# Altium schematic symbol library BARKO_SCHLIB.SchLib: 1064 symbols (part 8 of 11) (continued)
## MD-UG IC PROFINET (continued)

## MDFLT-BNX024H01L
designator MD?, comment BNX024H01L
FILTER LC 4.7UF SMD; Manufacturer: Murata; Max Current Rating: 15A; Max Voltage Rating (DC): 50V; Number of Channels: 2; Attenuation Value: 35dB; ESD Protection: No; Frequency: 100kHz; Impedance: 50R; Washability: OK; .Creator: M.OZKAN; .PCBCHK: USED; Supplier 1: Arrow; Manufacturer Part Number: BNX024H01L; Stock 1: 4400; Pricing 1: 400=3,20590, 800=3,10980, 2400=2,96200, 1=6,65300, 10=5,66000, 25=4,50300, 100=4,02700, 250=3,56600 (USD); RoHS: Yes; Mount: Surface Mount; Case/Package: SMD/SMT; Min Operating Temperature: -55°C; Max Operating Temperature: 125°C; Termination: Flat; Voltage Rating: 50V; Packaging: Tape and Reel; Package Quantity: 1; Current Rating: 15A; Circuit Type: Filter; Current: 15A; Voltage Rating (DC): 50V; Length: 12.1mm; Height: 0.146inch; Width: 9.1mm; Depth: 9.1mm; Radiation Hardening: No; REACH SVHC: No SVHC; Lead Free: Lead Free; ComponentLink1URL: https://datasheet.ciiva.com/4941/murata20bnx20series-303196-4941968.pdf?src-supplier=Mouser; ComponentLink1Description: https://datasheet.ciiva.com/4941/murata20bnx20series-303196-4941968.pdf?src-supplier=Mouser; ComponentLink2URL: https://datasheet.ciiva.com/18093/getdatasheetpartid-433557-18093311.pdf?src-supplier=Verical; ComponentLink2Description: https://datasheet.ciiva.com/18093/getdatasheetpartid-433557-18093311.pdf?src-supplier=Verical; ComponentLink3URL: https://datasheet.ciiva.com/29369/l0132s0198bnx02-29369302.pdf?src-supplier=Digi-Key; ComponentLink3Description: https://datasheet.ciiva.com/29369/l0132s0198bnx02-29369302.pdf?src-supplier=Digi-Key; ComponentLink4URL: https://datasheet.ciiva.com/29369/l0132s0198bnx02-29369304.pdf?src-supplier=Digi-Key; ComponentLink4Description: https://datasheet.ciiva.com/29369/l0132s0198bnx02-29369304.pdf?src-supplier=Digi-Key; ComponentLink5URL: https://datasheet.ciiva.com/29369/l0132s0198bnx02-29369306.pdf?src-supplier=Digi-Key; ComponentLink5Description: https://datasheet.ciiva.com/29369/l0132s0198bnx02-29369306.pdf?src-supplier=Digi-Key; Supplier Part Number 1: BNX024H01L; Capacitance: 4.7uF; .SCHCHK: USED
footprint SMD_12.10x9.10x3.7_6P
pins: 1 IN (power), 2 OUT (power), 3 RTN (power), 4 GND1 (power), 5 GND2 (power), 6 GND3 (power)

## MDPWR-CHS3002428
designator MD?, comment CHS3002428
ISOLATED DC/DC CONVERTERS 252W 1; Manufacturer: Cosel; Supplier 1: Digi-Key; Supplier Part Number 1: 1776-CHS3002428-ND; Manufacturer Part Number: CHS3002428; Stock: 30; Pricing: 1=91.81, 5=91.078, 10=90.35, 25=84.5204, 50=81.606, 100=77.5257 (USD); RoHS: No
footprint MD-DIP-CHS3002428
pins: +S, +VIN, +VOUT, -S, -VIN, -VOUT, RC, TRM
text: ISO

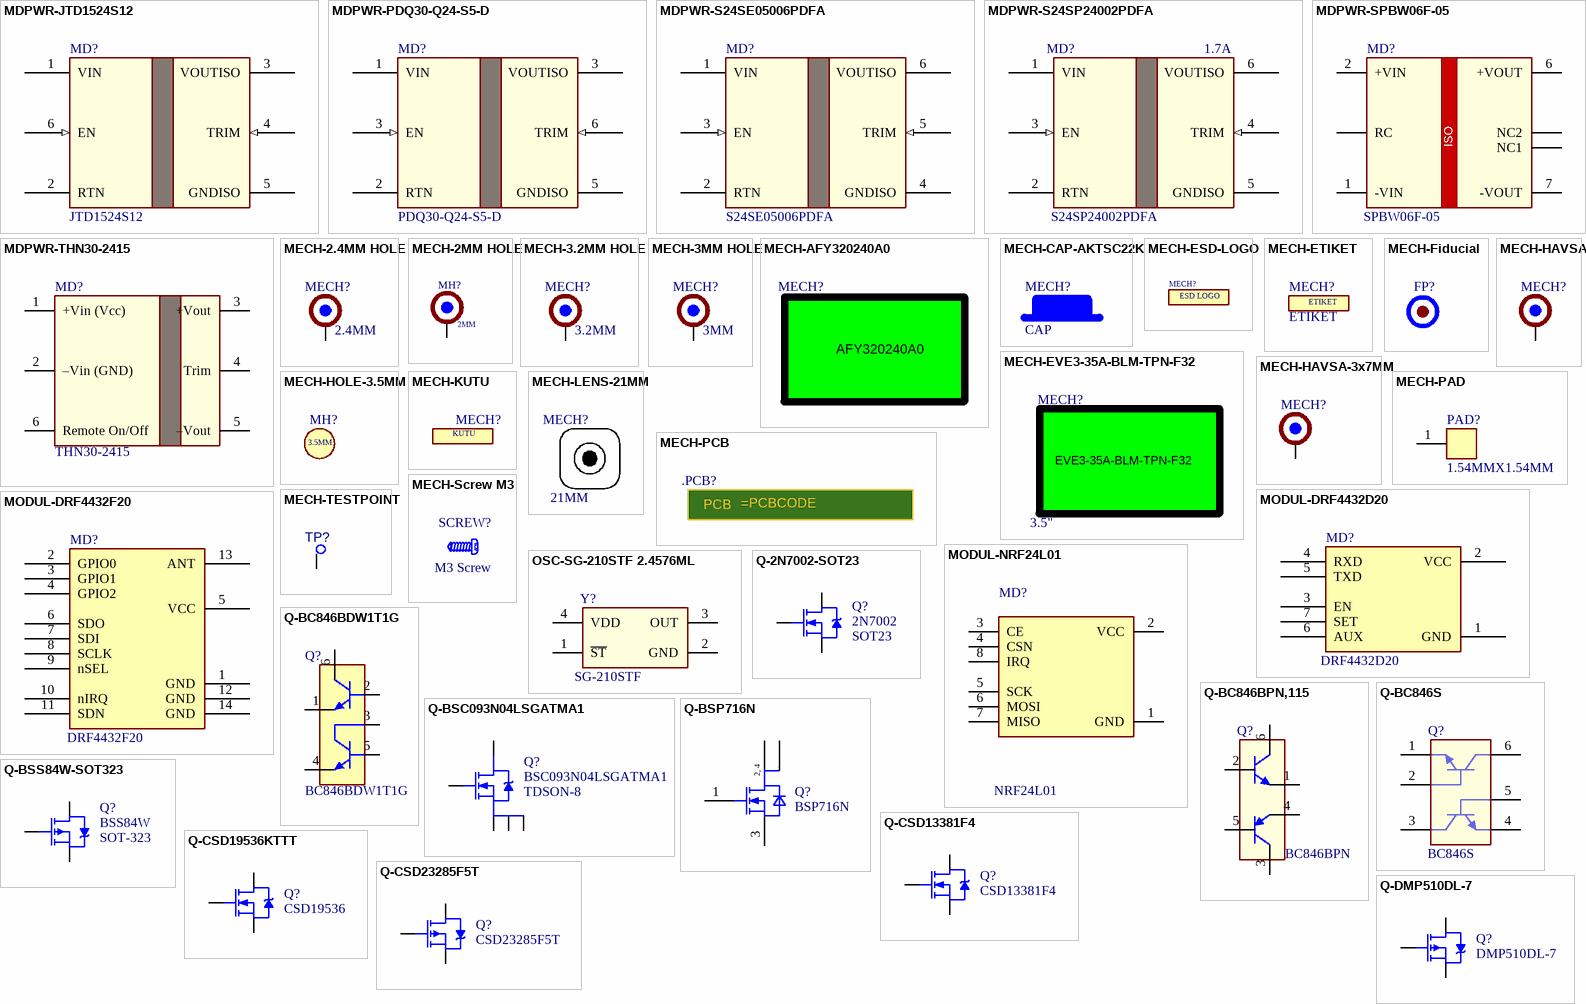
[diagram p33: symbols MDPWR-JTD1524S12 to Q-DMP510DL-7]

## MDPWR-JTD1524S12
designator MD?, comment JTD1524S12
DC DC CONVERTER 12V 15W; Manufacturer: XP Power; Washability: OK; .Creator: M.OZKAN; .PCBCHK: USED; Supplier 1: Digi-Key; Manufacturer Part Number: JTD1524S12; Stock 1: 50; Pricing 1: 1=28.00000, 5=27.16000, 10=26.32000, 25=25.20000, 100=23.52000 (USD); RoHS: No; ComponentLink1URL: http://www.farnell.com/datasheets/2259125.pdf?src-supplier=Farnell; ComponentLink1Description: http://www.farnell.com/datasheets/2259125.pdf?src-supplier=Farnell; ComponentLink2URL: https://www.xppower.com/Portals/0/pdfs/SF_JTD15.pdf?src-supplier=Digi-Key; ComponentLink2Description: https://www.xppower.com/Portals/0/pdfs/SF_JTD15.pdf?src-supplier=Digi-Key; Supplier Part Number 1: 1470-4222-ND; .SCHCHK: USED
footprint THT_40.6 X25.4X 10.5_6P
pins: 1 VIN (power), 2 RTN (power), 3 VOUTISO (power), 4 TRIM (in), 5 GNDISO, 6 EN (in)

## MDPWR-PDQ30-Q24-S5-D
designator MD?, comment PDQ30-Q24-S5-D
DC DC CONVERTER 5V 30W; Manufacturer: CUI; Number of Outputs: 1; Min Input Voltage: 9V; Max Input Voltage: 36V; Max Output Current: 6A; Isolation Voltage: 1.5kV; Efficiency: 90%; Washability: OK; .Creator: M.OZKAN; .PCBCHK: USED; Supplier 1: Digi-Key; Manufacturer Part Number: PDQ30-Q24-S5-D; Stock 1: 35; Pricing 1: 1=34,94000, 5=34,66800, 10=34,40000, 25=33,86240, 50=32,25000, 100=29,56250, 250=29,02500 (USD); RoHS: Yes; Mount: Through Hole; Case/Package: DIP; Min Operating Temperature: -40°C; Max Operating Temperature: 105°C; Packaging: Rail/Tube; Voltage - Output 1: 5V; Max Power Dissipation: 30W; Features: UVLO,OVP,OCP,OTP,SCP; Length: 1inch; Height: 0.4inch; Width: 1inch; Lead Free: Lead Free; ComponentLink1URL: https://www.cui.com/product/resource/digikeypdf/pdq30-d.pdf?src-supplier=Digi-Key; ComponentLink1Description: https://www.cui.com/product/resource/digikeypdf/pdq30-d.pdf?src-supplier=Digi-Key; Supplier Part Number 1: 102-3891-ND; .SCHCHK: USED
footprint SMD_25.4x24.4x10.2
pins: 1 VIN (power), 2 RTN (power), 3 EN (in), 3 VOUTISO (power), 5 GNDISO, 6 TRIM (in)

## MDPWR-S24SE05006PDFA
designator MD?, comment S24SE05006PDFA
DC DC CONVERTER 5V 30W; Manufacturer: Delta Design; Number of Outputs: 1; Efficiency: 89%; Min Input Voltage (DC): 9V; Max Input Voltage (DC): 36V; Max Output Current: 6A; Isolation Voltage: 1.6kV; Washability: OK; .Creator: M.OZKAN; .PCBCHK: USED; Supplier 1: Digi-Key; Manufacturer Part Number: S24SE05006PDFA; Stock 1: 684; Pricing 1: 1=40,59000, 5=40,27400, 10=39,95600, 25=38,68760, 50=36,78500, 100=34,24800, 250=33,74064 (USD); RoHS: Yes; Mount: Through Hole; Min Operating Temperature: -40°C; Max Operating Temperature: 85°C; Packaging: Rail/Tube; Package Quantity: 10; Min Input Voltage: 9V; Max Input Voltage: 36V; Voltage - Output 1: 5V; Max Power Dissipation: 30W; Features: UVLO; Length: 1inch; Height: 0.4inch; Width: 1inch; ComponentLink1URL: http://www.produktinfo.conrad.com/datenblaetter/1300000-1399999/001312204-da-01-en-DC_DC_WANDLER_S24SE05006PDFA_DELTA.pdf?src-supplier=Conrad; ComponentLink1Description: http://www.produktinfo.conrad.com/datenblaetter/1300000-1399999/001312204-da-01-en-DC_DC_WANDLER_S24SE05006PDFA_DELTA.pdf?src-supplier=Conrad; ComponentLink2URL: http://www.deltaww.com/filecenter/products/download/01/0102/datasheet/DS_S24SE_S24DE_30W.pdf?src-supplier=Digi-Key; ComponentLink2Description: http://www.deltaww.com/filecenter/products/download/01/0102/datasheet/DS_S24SE_S24DE_30W.pdf?src-supplier=Digi-Key; Supplier Part Number 1: 941-1630-ND; .SCHCHK: USED
footprint SMD_25.4x24.4x10.2
pins: 1 VIN (power), 2 RTN (power), 3 EN (in), 4 GNDISO, 5 TRIM (in), 6 VOUTISO (power)

## MDPWR-S24SP24002PDFA
designator MD?, comment S24SP24002PDFA  Max Output Current: 1.7A
DC/DC CONVERTER 24V 40W; Manufacturer: Delta Design; Number of Outputs: 1; Min Input Voltage: 9V; Max Input Voltage: 36V; Isolation Voltage: 1.5kV; Efficiency: 92.5%; Washability: OK; .Creator: M.OZKAN; .PCBCHK: USED; Supplier 1: Digi-Key; Manufacturer Part Number: S24SP24002PDFA; Stock 1: 200; Pricing 1: 1=47.74000, 5=47.37000, 10=46.99700, 25=45.50480, 50=43.26660, 100=40.28280, 250=39.68600 (USD); RoHS: Yes; Mount: Through Hole; Min Operating Temperature: -40°C; Max Operating Temperature: 85°C; Packaging: Bulk; Voltage - Output 1: 24V; Max Power Dissipation: 40W; Features: OVP,OCP,OTP,SCP; Length: 2inch; Height: 0.41inch; Width: 1inch; ComponentLink1URL: http://www.deltaww.com/fileCenter/products/download/01/0102/datasheet/DS_S24SP24002.pdf?src-supplier=Digi-Key; ComponentLink1Description: http://www.deltaww.com/fileCenter/products/download/01/0102/datasheet/DS_S24SP24002.pdf?src-supplier=Digi-Key; Supplier Part Number 1: 941-1757-ND; .SCHCHK: USED; Stock: 2004; Pricing: 1=0.45, 10=0.32, 50=0.2422, 100=0.2109, 500=0.1562, 1000=0.1328 (USD); ComponentLink2URL: http://www.farnell.com/datasheets/2741232.pdf?src-supplier=Farnell; ComponentLink2Description: http://www.farnell.com/datasheets/2741232.pdf?src-supplier=Farnell
footprint THT_50.8x25.4x10.5_6P
pins: 1 VIN (power), 2 RTN (power), 3 EN (in), 4 TRIM (in), 5 GNDISO, 6 VOUTISO (power)

## MDPWR-SPBW06F-05
designator MD?, comment SPBW06F-05
DC DC CONVERTER 5V 6W; Manufacturer: Mean Well; Supplier 1: Digi-Key; Supplier Part Number 1: 1866-4810-ND; Manufacturer Part Number: SPBW06F-05; Stock: 800; Pricing: 1=9.99, 10=9.839, 25=9.6876, 50=9.3848, 100=8.4766, 250=8.3252, 500=8.1739 (USD); RoHS: No; ComponentLink1URL: https://media.digikey.com/pdf/Data%20Sheets/Mean%20Well%20PDF's/SPBW06,DPBW06_Ds.pdf?src-supplier=Digi-Key; ComponentLink1Description: https://media.digikey.com/pdf/Data%20Sheets/Mean%20Well%20PDF's/SPBW06,DPBW06_Ds.pdf?src-supplier=Digi-Key
footprint MD- SPBW06
pins: 1 -VIN, 2 +VIN, 3 RC, 5 NC1, 6 +VOUT, 7 -VOUT, 8 NC2
text: ISO

## MDPWR-THN30-2415
designator MD?, comment THN30-2415
DC-DC 24VIN 1-OUT 24V 1.25A 30W 6-Pin; Manufacturer: Traco Power; Number of Outputs: 1; Efficiency: 91%; Max Input Voltage: 36V; Min Input Voltage: 18V; Isolation: Isolated; Isolation Voltage: 1.5kV; Supplier 1: RSComponents; Manufacturer Part Number: THN30-2415; Stock 1: 12; Pricing 1: 1=71,35700, 5=69,21200, 10=67,08000, 25=64,22000, 50=61,37300, 1=548,90000, 5=532,40000, 10=516,00000, 25=494,00000, 50=472,10000 (EUR); RoHS: Yes; Mount: Through Hole; Case/Package: Module; Number of Pins: 6; Weight: 16.5g; Min Operating Temperature: -40°C; Max Operating Temperature: 85°C; Output Voltage: 24V; Output Current: 1.25A; Nominal Output Voltage: 24V; Max Output Current: 1.25A; Max Output Power: 30W; Voltage - Output 1: 24V; Current - Output 1: 1.25A; Max Input Voltage (DC): 36V; Min Input Voltage (DC): 18V; Nominal Input Voltage: 24V; Length: 25.4mm; Height: 9.9mm; Width: 25.4mm; Depth: 25.4mm; REACH SVHC: No SVHC; ComponentLink1URL: https://datasheet.ciiva.com/41865/1718367-41865680.pdf?src-supplier=Newark; ComponentLink1Description: https://datasheet.ciiva.com/41865/1718367-41865680.pdf?src-supplier=Newark; ComponentLink2URL: https://datasheet.ciiva.com/30487/0900766b81210713-30487603.pdf?src-supplier=RSComponents; ComponentLink2Description: https://datasheet.ciiva.com/30487/0900766b81210713-30487603.pdf?src-supplier=RSComponents; ComponentLink3URL: https://datasheet.ciiva.com/46416/1763638-46416055.pdf?src-supplier=Element14; ComponentLink3Description: https://datasheet.ciiva.com/46416/1763638-46416055.pdf?src-supplier=Element14; Supplier Part Number 1: 7813373
footprint SMD_25.4x25.4x9.9 (THN 30-2415)
pins: 1 +Vin (Vcc) (power), 2 –Vin (GND) (power), 3 +Vout, 4 Trim, 5 –Vout, 6 Remote On/Off (power)

## MECH-2.4MM HOLE
designator MECH?, comment 2.4MM  (no BOM)
.Creator: F:TALI; .PCBCHK: USED; Washability: OK; .SCHCHK: USED
footprint MECH-2.4MM HOLE
pins: 1

## MECH-2MM HOLE
designator MH?, comment 2MM  (no BOM)
.PCBCHK: USED; .Creator: F:TALI; Washability: OK; .SCHCHK: USED
footprint MECH-2MM
pins: 1

## MECH-3.2MM HOLE
designator MECH?, comment 3.2MM  (no BOM)
.Creator: F:TALI; .PCBCHK: USED; Washability: OK; .SCHCHK: USED
footprint MECH-3.2MM HOLE
pins: 1

## MECH-3MM HOLE
designator MECH?, comment 3MM  (no BOM)
.Creator: F:TALI; .PCBCHK: USED; Washability: OK; .SCHCHK: USED
footprint MECH-3MM HOLE
pins: 1

## MECH-AFY320240A0
designator MECH?, comment AFY320240A0
IPS 3.5" 320240 SPI+24BIT RGB; Manufacturer Part Number: AFY320240A0-3.5INTH; ComponentLink1Description: Datasheet; ComponentLink1URL: https://www.orientdisplay.com/wp-content/uploads/2019/12/AFY320240A0-3.5INTH-spec.pdf
footprint MECH-AFY320240A0

## MECH-CAP-AKTSC22K
designator MECH?, comment CAP  (mechanical)
CAP TACTILE ROUND BLACK; Manufacturer: APEM; Manufacturer Part Number: KTSC-22K; Illumination Type: Non-Illuminated; Supplier 1: Digi-Key; Supplier Part Number 1: 679-2315-ND; Stock: 16244; Pricing: 1=0.23, 10=0.216, 25=0.2116, 50=0.207, 100=0.2025, 250=0.1935, 500=0.189, 1000=0.144, 5000=0.135 (USD); RoHS: Yes; Color: Black; Shape: Round; Min Operating Temperature: -25°C; Max Operating Temperature: 70°C; Package Quantity: 100; Height: 5.7mm; ComponentLink1URL: https://datasheet.ciiva.com/12445/adts6-adtsm-ktsc6-263747-12445134.pdf?src-supplier=Mouser; ComponentLink1Description: https://datasheet.ciiva.com/12445/adts6-adtsm-ktsc6-263747-12445134.pdf?src-supplier=Mouser; ComponentLink2URL: https://datasheet.ciiva.com/16171/adts6-adtsm-ktsc6-16171454.pdf?src-supplier=Onlinecomponents.com; ComponentLink2Description: https://datasheet.ciiva.com/16171/adts6-adtsm-ktsc6-16171454.pdf?src-supplier=Onlinecomponents.com

## MECH-ESD-LOGO
designator MECH?  (value not drawn)  (no BOM)
.Creator: F:TALI; .PCBCHK: USED; Washability: OK; .SCHCHK: USED
footprint ESD-LOGO-2
footprint ESD_LOGO_4
footprint ESD_LOGO_5
text: ESD LOGO

## MECH-ETIKET
designator MECH?, comment ETIKET  (no BOM)
Washability: OK; .Creator: M.OZKAN; .PCBCHK: USED; .SCHCHK: USED
footprint MECH-ETIKET

## MECH-EVE3-35A-BLM-TPN-F32
designator MECH?, comment 3.5"
3.5" 320X240 PIXEL NON-TOUCH SPI; Manufacturer: Matrix Orbital; Manufacturer Part Number: EVE3-35A-BLM-TPN-F32; Supplier 1: Digi-Key; Supplier Part Number 1: 635-EVE3-35A-BLM-TPN-F32-ND; Stock: 96; Pricing: 1=46.71, 25=45.6004, 50=44.52, 100=42.8701, 200=42.1903 (USD)
footprint MECH-AFY320240A0

## MECH-Fiducial
designator FP?  (value not drawn)  (no BOM)
.PCBCHK: USED; .Creator: F:TALI; Washability: OK; .SCHCHK: USED
footprint MECH-Fiducial

## MECH-HAVSA
designator MECH?  (no BOM)
.Creator: F:TALI; .PCBCHK: USED; Washability: OK; .SCHCHK: USED
footprint MECH-HAVSA BASLIK
pins: 1

## MECH-HAVSA-3x7MM
designator MECH?  (no BOM)
.Creator: F:TALI; .PCBCHK: USED; Washability: OK; .SCHCHK: USED
footprint MECH-HAVSA BASLIK - 3x7MM
pins: 1

## MECH-HOLE-3.5MM
designator MH?, comment 3.5MM  (no BOM)
.PCBCHK: USED; .Creator: F:TALI; Washability: OK; .SCHCHK: USED
footprint MECH-3.5MM

## MECH-KUTU
designator MECH?  (value not drawn)  (no BOM)
.Creator: F:TALI; .PCBCHK: USED; Washability: OK; .SCHCHK: USED
footprint MECH-HEMSIRE PANELI
text: KUTU

## MECH-LENS-21MM
designator MECH?, comment 21MM
15 DERECELİK 50 KURUSLUK LENS; Manufacturer: Ledil; Manufacturer Part Number: CP13072_IRENE-IR-16; Shape: Round; .Creator: M.OZKAN; .PCBCHK: USED; Supplier 1: RSComponents; Supplier Part Number 1: 8910618; Stock: 12; Pricing: 4=14.48, 40=12.85, 100=8.3, 200=7.88, 400=7.45, 4=14.48, 40=12.85, 100=8.3, 200=7.88, 400=7.45 (EUR); RoHS: Yes; Number of Pins: 1; Package Quantity: 112; Packaging: Tray; Diameter: 21.6mm; Length: 21.6mm; Height: 14.28mm; Width: 14.28mm; Radiation Hardening: No; Lead Free: Lead Free; ComponentLink1URL: https://datasheet.ciiva.com/29556/13072-ledil-datasheet-29556323.pdf?src-supplier=Digi-Key; ComponentLink1Description: https://datasheet.ciiva.com/29556/13072-ledil-datasheet-29556323.pdf?src-supplier=Digi-Key; ComponentLink2URL: https://datasheet.ciiva.com/12399/irene-sfh+4715s+28ir29-ledil-datasheet-12399669.pdf?src-supplier=Mouser; ComponentLink2Description: https://datasheet.ciiva.com/12399/irene-sfh+4715s+28ir29-ledil-datasheet-12399669.pdf?src-supplier=Mouser; .SCHCHK: USED
footprint MECH-LENS-21MM-15

## MECH-PAD
designator PAD?, comment 1.54MMX1.54MM  (no BOM)
.Creator: F:TALI; .PCBCHK: USED; Washability: OK; .SCHCHK: USED
footprint MECH-PAD
pins: 1

## MECH-PCB
designator .PCB?, comment PCB
BMS KONTROL UNITESI ELEKTRONIK KARTI; .Creator: F:TALI; .PCBCHK: USED; Washability: OK; .SCHCHK: USED; Manufacturer Part Number: =PCBCODE
footprint MECH-PCBCODE

## MECH-Screw M3
designator SCREW?, comment M3 Screw  (no BOM)
Screw; Washability: OK; .Creator: M.OZKAN; .PCBCHK: USED; .SCHCHK: USED
footprint MECH-SCREW M3 (YSB)

## MECH-TESTPOINT
designator TP?  (value not drawn)  (no BOM)
.PCBCHK: USED; .Creator: F:TALI; Washability: OK; .SCHCHK: USED
pins: 1

## MODUL-DRF4432D20
designator MD?, comment DRF4432D20
20dBm ISM RF Tranvceiver Module; Washability: OK; .Creator: M.OZKAN; .PCBCHK: USED; .SCHCHK: USED
footprint MOD-DRF4432D20
pins: 1 GND, 2 VCC, 3 EN, 4 RXD, 5 TXD, 6 AUX, 7 SET

## MODUL-DRF4432F20
designator MD?, comment DRF4432F20
20dBm ISM RF Tranvceiver Module; Washability: OK; .Creator: M.OZKAN; .PCBCHK: USED; .SCHCHK: USED
footprint MOD-DRF4432F20
pins: 1 GND, 2 GPIO0, 3 GPIO1, 4 GPIO2, 5 VCC, 6 SDO, 7 SDI, 8 SCLK, 9 nSEL, 10 nIRQ, 11 SDN, 12 GND, 13 ANT, 14 GND

## MODUL-NRF24L01
designator MD?, comment NRF24L01
2.4GHz Wireless Transceiver Module; Manufacturer Part Number: NRF24L01 + PA + LNA; Washability: OK; .Creator: M.OZKAN; .PCBCHK: USED; .SCHCHK: USED
footprint MOD-NRF24L01
pins: 1 GND, 2 VCC, 3 CE, 4 CSN, 5 SCK, 6 MOSI, 7 MISO, 8 IRQ

## OSC-SG-210STF 2.4576ML
designator Y?, comment SG-210STF
XTAL OSC XO 2.4576MHZ CMOS SMD; Manufacturer: Epson; Manufacturer Part Number: SG-210STF 2.4576ML; Max Supply Current: 1.8mA; Frequency Stability: 50ppm; Supplier 1: Digi-Key; Supplier Part Number 1: SER3866-ND; Stock: 214; Pricing: 1=1.22, 10=1.081, 50=1.0106, 100=0.893 (USD); RoHS: Yes; Mount: Surface Mount; Case/Package: SMD/SMT; Min Operating Temperature: -40°C; Max Operating Temperature: 85°C; Frequency: 2.4576MHz; Packaging: Cut Strip; Length: 0.098inch; Height: 0.035inch; Width: 0.079inch; ComponentLink1URL: https://datasheet.ciiva.com/29629/029-sg-210stf-e147-29629205.pdf?src-supplier=Digi-Key; ComponentLink1Description: https://datasheet.ciiva.com/29629/029-sg-210stf-e147-29629205.pdf?src-supplier=Digi-Key
footprint CRYSTAL-2.5X2
pins: 1 ~{ST}, 2 GND, 3 OUT, 4 VDD

## Q-2N7002-SOT23
designator Q?, comment 2N7002  Case/Package: SOT23
MOSFET N-CH 60V 0.115A SOT-23; Manufacturer: Diodes; Manufacturer Part Number: 2N7002-HT; Continuous Drain Current (ID): 115mA; Rise Time: 3ns; Nominal Vgs: 2.5V; Max Power Dissipation: 300mW; Gate to Source Voltage (Vgs): 20V; Fall Time: 5.6ns; Turn-Off Delay Time: 11ns; Turn-On Delay Time: 7ns; Rds On Max: 7.5R; Input Capacitance: 50pF; Number of Elements: 1; Drain to Source Breakdown Voltage: 70V; Power Dissipation: 540mW; Element Configuration: Single; Current: 115A; .PCBCHK: USED; .Creator: F:TALI; Washability: OK; Stock 1: 71613; Pricing 1: 1=0.22, 10=0.199, 100=0.1305, 500=0.0638, 1000=0.04349 (USD); Mount: Surface Mount; Number of Pins: 3; Weight: 0.000282oz; Contact Plating: Matte,Tin; Min Operating Temperature: -55°C; Max Operating Temperature: 150°C; Drain to Source Voltage (Vdss): 60V; Packaging: Tape and Reel; Package Quantity: 3000; Dual Supply Voltage: 60V; Number of Channels: 1; Drain to Source Resistance: 7.5R; On-State Resistance: 7.5R; Threshold Voltage: 2.5V; Termination: SMD/SMT; Voltage Rating (DC): 60V; Current Rating: 115mA; Voltage: 60V; Length: 2.9mm; Height: 1mm; Width: 1.3mm; Radiation Hardening: No; REACH SVHC: No SVHC; Lead Free: Lead Free; ComponentLink1URL: http://www.diodes.com/datasheets/ds11303.pdf; ComponentLink1Description: http://www.diodes.com/datasheets/ds11303.pdf; ComponentLink2URL: https://www.verical.com/server-webapp/html/getDatasheet?partID=110059; ComponentLink2Description: https://www.verical.com/server-webapp/html/getDatasheet?partID=110059; ComponentLink3URL: http://www.alliedelec.com/images/products/datasheets/bm/DIODES%20INC/70437206.pdf; ComponentLink3Description: http://www.alliedelec.com/images/products/datasheets/bm/DIODES%20INC/70437206.pdf; ComponentLink4URL: http://www.farnell.com/datasheets/1915452.pdf; ComponentLink4Description: http://www.farnell.com/datasheets/1915452.pdf; ComponentLink5URL: http://www.farnell.com/datasheets/2096661.pdf; ComponentLink5Description: http://www.farnell.com/datasheets/2096661.pdf; Supplier 1: ÖZDİSAN; Supplier Part Number: 2N7002-HT; Supplier 2: Digi-Key; Stock 2: 71613; Pricing 2: 1=0.22, 10=0.199, 100=0.1305, 500=0.0638, 1000=0.04349 (USD); Supplier Part Number 2: 2N7002-FDIDKR-ND; Supplier 3: Digi-Key; Stock 3: 0; Pricing 3: 1=0.25, 10=0.227, 100=0.1269, 500=0.06798, 1000=0.04623 (USD); Supplier Part Number 3: 1727-2764-6-ND; Supplier 4: Digi-Key; Stock 4: 0; Pricing 4: 1=0.28, 10=0.252, 100=0.1411, 500=0.07562, 1000=0.05142 (USD); Halogen Free: Halogen Free; ComponentLink6URL: http://www.onsemi.com/pub/Collateral/2N7002L-D.PDF; ComponentLink6Description: http://www.onsemi.com/pub/Collateral/2N7002L-D.PDF; ComponentLink7URL: http://www.farnell.com/datasheets/1747988.pdf; ComponentLink7Description: http://www.farnell.com/datasheets/1747988.pdf; ComponentLink8URL: http://www.farnell.com/datasheets/2354034.pdf; ComponentLink8Description: http://www.farnell.com/datasheets/2354034.pdf; ComponentLink9URL: http://www.onsemi.com/pub_link/Collateral/2N7002L-D.PDF; ComponentLink9Description: http://www.onsemi.com/pub_link/Collateral/2N7002L-D.PDF; Supplier Part Number 4: 2N7002LT1GOSDKR-ND; Supplier 5: Digi-Key; Stock 5: 708565; Pricing 5: 1=0.26, 10=0.237, 100=0.1324, 500=0.07096, 1000=0.04825 (USD); Supplier Part Number 5: 2N7002K-T1-E3DKR-ND; .SCHCHK: USED
footprint Model Name (Model Description)
footprint SOT23-3
pins: 1 G, 2 S, 3 D

## Q-BC846BDW1T1G
designator Q?, comment BC846BDW1T1G
TRANS 2NPN 65V 0.1A SOT363; Manufacturer: On Semiconductor; IC Continuous (A): 0.1; fT Min (MHz): 100; Polarity: Dual NPN; Packing: Tape and Reel; Max Power Dissipation: 380mW; Max Collector Current: 100mA; Collector Base Voltage (VCBO): 80V; Frequency: 100MHz; Number of Elements: 2; hFE Min: 200; Emitter Base Voltage (VEBO): 6V; Collector Emitter Saturation Voltage: 600mV; Element Configuration: Dual; Washability: OK; .Creator: M.OZKAN; .PCBCHK: USED; PartNumber: BC846BDW1T1G; ComponentLink3Description: Package Specification; PackageVersion: Rev. W, 01/2006; ComponentLink2URL: http://www.onsemi.cn/pub_link/Collateral/BC846BDW1T1-D.PDF; PackageDescription: 6-Pin Small Outline Transistor, Body 2 x 1.25 mm, Pitch 0.65 mm; ComponentLink2Description: Datasheet; PackageReference: SOT-363-6-419B-02_W; RoHS: TRUE; ComponentLink3URL: http://www.onsemi.com/pub_link/Collateral/NTJD4001N-D.PDF; DatasheetVersion: Rev. 9; ComponentLink1Description: Manufacturer URL; Mounting Technology: Surface Mount; ComponentLink1URL: http://www.onsemi.com/; Supplier 1: Digi-Key; Supplier Part Number 1: BC846BDW1T1GOSCT-ND; Manufacturer Part Number: BC846BDW1T1G; Stock 1: 194412; Pricing 1: 1=0.20000, 10=0.16300, 100=0.06660, 500=0.05556, 1000=0.03861 (USD); Case/Package: SOT-363-6; Number of Pins: 6; Contact Plating: Tin,Matte; Min Operating Temperature: -55°C; Max Operating Temperature: 150°C; Collector Emitter Voltage (VCEO): 65V; Package Quantity: 1; Packaging: Tape and Reel; Transition Frequency: 100MHz; Collector Emitter Breakdown Voltage: 65V; Max Breakdown Voltage: 65V; Power Dissipation: 380mW; Gain Bandwidth Product: 100MHz; Max Frequency: 100MHz; Voltage Rating (DC): 65V; Current Rating: 100mA; Length: 2mm; Height: 0.9mm; Width: 1.25mm; Radiation Hardening: No; REACH SVHC: No SVHC; Lead Free: Lead Free; Halogen Free: Halogen Free; ComponentLink4URL: https://datasheet.ciiva.com/968/bc846bdw1t1-d-968800.pdf?src-supplier=Digi-Key; ComponentLink4Description: https://datasheet.ciiva.com/968/bc846bdw1t1-d-968800.pdf?src-supplier=Digi-Key; ComponentLink5URL: https://datasheet.ciiva.com/17064/0900766b80dabb08-17064908.pdf?src-supplier=Allied+Electronics; ComponentLink5Description: https://datasheet.ciiva.com/17064/0900766b80dabb08-17064908.pdf?src-supplier=Allied+Electronics; ComponentLink6URL: https://datasheet.ciiva.com/15138/getdatasheetpartid-53817-15138804.pdf?src-supplier=Verical; ComponentLink6Description: https://datasheet.ciiva.com/15138/getdatasheetpartid-53817-15138804.pdf?src-supplier=Verical; ComponentLink7URL: https://datasheet.ciiva.com/968/bc846bdw1t1-d-968801.pdf?src-supplier=Digi-Key; ComponentLink7Description: https://datasheet.ciiva.com/968/bc846bdw1t1-d-968801.pdf?src-supplier=Digi-Key; ComponentLink8URL: https://datasheet.ciiva.com/1193/bc846bdw1t1-d-1193751.pdf?src-supplier=Element14; ComponentLink8Description: https://datasheet.ciiva.com/1193/bc846bdw1t1-d-1193751.pdf?src-supplier=Element14; ComponentLink9URL: https://datasheet.ciiva.com/968/bc846bdw1t1-d-968799.pdf?src-supplier=Digi-Key; ComponentLink9Description: https://datasheet.ciiva.com/968/bc846bdw1t1-d-968799.pdf?src-supplier=Digi-Key; ComponentLink10URL: https://datasheet.ciiva.com/11197/bc846bdw1t1-d-11197781.pdf?src-supplier=Avnet; ComponentLink10Description: https://datasheet.ciiva.com/11197/bc846bdw1t1-d-11197781.pdf?src-supplier=Avnet; ComponentLink11URL: https://datasheet.ciiva.com/22653/1708249-22653899.pdf?src-supplier=Element14; ComponentLink11Description: https://datasheet.ciiva.com/22653/1708249-22653899.pdf?src-supplier=Element14; ComponentLink12URL: https://datasheet.ciiva.com/16418/bc846bdw1t1-d-16418524.pdf?src-supplier=Future+Electronics; ComponentLink12Description: https://datasheet.ciiva.com/16418/bc846bdw1t1-d-16418524.pdf?src-supplier=Future+Electronics; ComponentLink13URL: https://datasheet.ciiva.com/43505/2012179-43505580.pdf?src-supplier=Jameco; ComponentLink13Description: https://datasheet.ciiva.com/43505/2012179-43505580.pdf?src-supplier=Jameco; .SCHCHK: USED
footprint TSSOP6(SOT363)
pins: 1 E, 2 B, 3 C, 4 E, 5 B, 6 C

## Q-BC846BPN,115
designator Q?, comment BC846BPN
TRANS NPN/PNP 65V 0.1A 6TSSOP; Manufacturer 1: Nexperia; Manufacturer Part Number 1: BC846BPN,115; Washability: OK; .Creator: M.OZKAN; .PCBCHK: USED; Supplier 1: Digi-Key; Supplier Part Number 1: 1727-4846-1-ND; Stock 1: 20585; Pricing 1: 1=0.33000, 10=0.26800, 25=0.22400, 100=0.10960, 250=0.10780, 500=0.09138, 1000=0.06350 (USD); RoHS: No; ComponentLink1URL: http://www.mouser.com/ds/2/302/BC846BPN-108518.pdf?src-supplier=Mouser; ComponentLink1Description: http://www.mouser.com/ds/2/302/BC846BPN-108518.pdf?src-supplier=Mouser; .SCHCHK: USED
footprint TSSOP6(SOT363)
pins: 1, 2, 3, 4, 5, 6

## Q-BC846S
designator Q?, comment BC846S
TRANS 2NPN 65V 0.1A 6TSSOP; Manufacturer: Infineon; VCE (max): 5Â V; ICBO (max): 15Â nA; VEBO (max): 6Â V; IC: 100 mA; Polarity: NPN; VCBO (max): 80Â V; Ptot (max): 250 mV; VCEO (max): 65Â V; Packing: Reel; fT (typ): 250Â MHz; Green: TRUE; ICM (max): 200Â mA; Max Power Dissipation: 250mW; Max Collector Current: 100mA; Collector Base Voltage (VCBO): 80V; Emitter Base Voltage (VEBO): 6V; Collector Emitter Saturation Voltage: 600mV; Max Frequency: 250MHz; Current: 1A; Washability: OK; .Creator: M.OZKAN; .PCBCHK: USED; Mounting Technology: Surface Mount; ComponentLink1Description: Manufacturer URL; Halogen-free: TRUE; PackageDescription: 6-Pin Small Outline Transistor Package, 1.25 x 2 mm Body; ComponentLink1URL: http://www.infineon.com/; PartNumber: BC846S; VCE: 5Â V; ComponentLink3Description: Package Specification; ComponentLink2Description: Datasheet; ComponentLink2URL: http://www.infineon.com/dgdl/bc846s_bc846u_bc847s.pdf?folderId=db3a30431441fb5d0114498f7eab01ce&fileId=db3a30431441fb5d01144990b2e801cf; IC (max): 100 mA; PackageReference: SOT363; ComponentLink3URL: http://www.infineon.com/dgdl/SOT363-Package_Overview.pdf?folderId=db3a30431936bc4b01195360bd8f3cdc&fileId=db3a30431936bc4b0119536b62bf3cf5; Supplier 1: Digi-Key; Supplier Part Number 1: BC846SH6327XTSA1CT-ND; Manufacturer Part Number: BC846S; Stock 1: 21248; Pricing 1: 1=0.37000, 10=0.30700, 100=0.12550, 500=0.10470, 1000=0.07275 (USD); RoHS: Yes; Case/Package: SOT; Number of Pins: 6; Max Operating Temperature: 150°C; Packaging: Tape and Reel; Collector Emitter Voltage (VCEO): 65V; Voltage: 65V; Length: 2mm; Height: 0.8mm; Width: 1.25mm; Halogen Free: Halogen Free; ComponentLink4URL: http://uk.rs-online.com/webdocs/14f5/0900766b814f52b7.pdf?src-supplier=RSComponents; ComponentLink4Description: http://uk.rs-online.com/webdocs/14f5/0900766b814f52b7.pdf?src-supplier=RSComponents; .SCHCHK: USED
footprint TSSOP6(SOT363)
pins: 1 E1, 2 B1, 3 C2, 4 E2, 5 B2, 6 C1

## Q-BSC093N04LSGATMA1
designator Q?, comment BSC093N04LSGATMA1  Package: TDSON-8
MOSFET N-CH 40V 49A TDSON-8; Manufacturer: Infineon; Rise Time: 2.4ns; Continuous Drain Current (ID): 13A; Rds On Max: 9.3mR; Input Capacitance: 1.9nF; Max Power Dissipation: 35W; Power Dissipation: 2.5W; Turn-On Delay Time: 3.6ns; Turn-Off Delay Time: 16ns; Fall Time: 2.8ns; Gate to Source Voltage (Vgs): 20V; Number of Elements: 1; Washability: OK; .Creator: M.OZKAN; .PCBCHK: USED; Supplier 1: Mouser; Manufacturer Part Number: BSC093N04LSGATMA1; Stock 1: 32240; Pricing 1: 1=0,83000, 10=0,69400, 100=0,44800, 1000=0,35900, 5000=0,35900, 10000=0,35900 (USD); RoHS: Yes; Mount: Surface Mount; Number of Pins: 8; Contact Plating: Tin,Matte; Min Operating Temperature: -55°C; Max Operating Temperature: 150°C; Packaging: Tape and Reel; Drain to Source Voltage (Vdss): 40V; Max Dual Supply Voltage: 40V; Radiation Hardening: No; REACH SVHC: No SVHC; Halogen Free: Halogen Free; Lead Free: Contains Lead; ComponentLink1URL: https://datasheet.ciiva.com/8115/infineon-bsc093n04lsg-ds-v02-01-en-8115122.pdf?src-supplier=Avnet; ComponentLink1Description: https://datasheet.ciiva.com/8115/infineon-bsc093n04lsg-ds-v02-01-en-8115122.pdf?src-supplier=Avnet; ComponentLink2URL: https://datasheet.ciiva.com/8115/infineon-bsc093n04lsg-ds-v02-01-en-8115125.pdf?src-supplier=Avnet; ComponentLink2Description: https://datasheet.ciiva.com/8115/infineon-bsc093n04lsg-ds-v02-01-en-8115125.pdf?src-supplier=Avnet; Supplier Part Number 1: 726-BSC093N04LSG; .SCHCHK: USED
footprint TDSON-8
pins: 1, 2, 3, 4, 9

## Q-BSP716N
designator Q?, comment BSP716N
MOSFET N-CH 75V 2.3A SOT223; Manufacturer: Infineon Technologies; Manufacturer Part Number: BSP716NH6327XTSA1; Rise Time: 5.5ns; Rds On Max: 160mR; Input Capacitance: 315pF; Max Power Dissipation: 1.8W; Gate to Source Voltage (Vgs): 20V; Washability: OK; .Creator: M.OZKAN; .PCBCHK: USED; ManufacturerPartNumber: BSP716N; PackageReference: PG-SOT223-4; Supplier 1: Digi-Key; Stock 1: 1000; Pricing 1: 1=0.48000, 10=0.41500, 100=0.30980, 500=0.24340 (USD); RoHS: Yes; Mount: Surface Mount; Case/Package: SOT-223; Number of Pins: 4; Contact Plating: Tin; Min Operating Temperature: -55°C; Max Operating Temperature: 150°C; Packaging: Tape and Reel; Drain to Source Voltage (Vdss): 75V; Continuous Drain Current (ID): 2.3A; Max Dual Supply Voltage: 75V; Lead Free: Lead Free; Halogen Free: Halogen Free; ComponentLink1URL: http://www.mouser.com/ds/2/196/Infineon-BSP716N-DS-v02_00-en-535472.pdf?src-supplier=Mouser; ComponentLink1Description: http://www.mouser.com/ds/2/196/Infineon-BSP716N-DS-v02_00-en-535472.pdf?src-supplier=Mouser; ComponentLink2URL: http://www.farnell.com/datasheets/2371093.pdf?src-supplier=Farnell; ComponentLink2Description: http://www.farnell.com/datasheets/2371093.pdf?src-supplier=Farnell; ComponentLink3URL: http://www.infineon.com/dgdl/BSP716N_rev2.0.pdf?folderId=db3a3043156fd573011622e10b5c1f67&fileId=db3a304341c1e4a10141da580f3529e9&src-supplier=Avnet; ComponentLink3Description: http://www.infineon.com/dgdl/BSP716N_rev2.0.pdf?folderId=db3a3043156fd573011622e10b5c1f67&fileId=db3a304341c1e4a10141da580f3529e9&src-supplier=Avnet; ComponentLink4URL: http://www.infineon.com/dgdl/Infineon-BSP716N-DS-v02_00-en.pdf?fileId=db3a304341c1e4a10141da580f3529e9&src-supplier=Digi-Key; ComponentLink4Description: http://www.infineon.com/dgdl/Infineon-BSP716N-DS-v02_00-en.pdf?fileId=db3a304341c1e4a10141da580f3529e9&src-supplier=Digi-Key; ComponentLink5URL: https://www.infineon.com/dgdl/Infineon-BSP716N-DS-v02_00-en.pdf?fileId=db3a304341c1e4a10141da580f3529e9&src-supplier=Digi-Key; ComponentLink5Description: https://www.infineon.com/dgdl/Infineon-BSP716N-DS-v02_00-en.pdf?fileId=db3a304341c1e4a10141da580f3529e9&src-supplier=Digi-Key; Supplier Part Number 1: BSP716NH6327XTSA1CT-ND; .SCHCHK: USED
footprint SOT223 (SOT,2.30mm pitch;4 pin,3.50mm W X 6.50mm L X 1.70mm H body)
pins: 1 GATE, 2 DRAIN, 3 SOURCE, 4 DRAIN
text: 2, 4

## Q-BSS84W-SOT323
designator Q?, comment BSS84W  Case/Package: SOT-323
MOSFET P-CH 50V 130MA SOT323; Manufacturer: Diodes; Manufacturer Part Number: BSS84W-7-F; Turn-Off Delay Time: 18ns; Turn-On Delay Time: 10ns; Gate to Source Voltage (Vgs): 20V; Nominal Vgs: -1.6V; Input Capacitance: 45pF; Number of Elements: 1; Max Power Dissipation: 200mW; Rds On Max: 10R; Drain to Source Resistance: 6R; Drain to Source Voltage (Vdss): -50V; Element Configuration: Single; Current Rating: -130mA; .PCBCHK: USED; .Creator: F:TALI; Washability: OK; Supplier 1: Digi-Key; Supplier Part Number 1: BSS84W-FDIDKR-ND; Stock 1: 301378; Pricing 1: 1=0.5, 10=0.357, 100=0.2102, 500=0.11896, 1000=0.09121 (USD); Mount: Surface Mount; Number of Pins: 3; Weight: 0.000212oz; Contact Plating: Matte,Tin; Min Operating Temperature: -55°C; Max Operating Temperature: 150°C; Continuous Drain Current (ID): 130mA; Packaging: Tape and Reel; Package Quantity: 3000; Power Dissipation: 200mW; Threshold Voltage: -1.6V; Number of Channels: 1; Voltage Rating (DC): -50V; On-State Resistance: 10R; Length: 2.2mm; Height: 1mm; Width: 1.35mm; Radiation Hardening: No; REACH SVHC: No SVHC; Lead Free: Lead Free; ComponentLink1URL: https://www.verical.com/server-webapp/html/getDatasheet?partID=91759; ComponentLink1Description: https://www.verical.com/server-webapp/html/getDatasheet?partID=91759; ComponentLink2URL: http://www.farnell.com/datasheets/1915463.pdf; ComponentLink2Description: http://www.farnell.com/datasheets/1915463.pdf; ComponentLink3URL: http://www.mouser.com/ds/2/115/ds30205-79185.pdf; ComponentLink3Description: http://www.mouser.com/ds/2/115/ds30205-79185.pdf; ComponentLink4URL: http://www.diodes.com//datasheets/ds30205.pdf; ComponentLink4Description: http://www.diodes.com//datasheets/ds30205.pdf; ComponentLink5URL: http://docs-europe.electrocomponents.com/webdocs/14a3/0900766b814a381f.pdf; ComponentLink5Description: http://docs-europe.electrocomponents.com/webdocs/14a3/0900766b814a381f.pdf; ComponentLink6URL: https://www.diodes.com/assets/Datasheets/ds30205.pdf; ComponentLink6Description: https://www.diodes.com/assets/Datasheets/ds30205.pdf; ComponentLink7URL: http://www.jameco.com/Jameco/Products/ProdDS/1539489.pdf; ComponentLink7Description: http://www.jameco.com/Jameco/Products/ProdDS/1539489.pdf; .SCHCHK: USED
footprint SOT323-3
pins: 1 G, 2 S, 3 D

## Q-CSD13381F4
designator Q?, comment CSD13381F4
MOSFET N-CH 12V 2.1A 3PICOSTAR; Manufacturer: Texas Instruments; Rds On Max: 180mR; Input Capacitance: 200pF; Rise Time: 1.5ns; Max Power Dissipation: 500mW; Gate to Source Voltage (Vgs): 8V; Turn-On Delay Time: 3.7ns; Turn-Off Delay Time: 11ns; Fall Time: 3.8ns; Element Configuration: Single; Number of Channels: 1; Washability: OK; .Creator: M.OZKAN; .PCBCHK: USED; Supplier 1: Digi-Key; Manufacturer Part Number: CSD13381F4; Stock 1: 397961; Pricing 1: 1 = 0.46000, 10 = 0.33400, 100 = 0.19650, 500 = 0.11124, 1000 = 0.08528 (USD); RoHS: Yes; Mount: Surface Mount; Case/Package: QFN; Number of Pins: 3; Min Operating Temperature: -55°C; Max Operating Temperature: 150°C; Package Quantity: 3000; Packaging: Tape and Reel; Drain to Source Voltage (Vdss): 12V; Continuous Drain Current (ID): 2.1A; Drain to Source Breakdown Voltage: 12V; Drain to Source Resistance: 180mR; Number of Elements: 1; Power Dissipation: 500mW; Lead Free: Lead Free; ComponentLink1URL: https://datasheet.ciiva.com/29742/csd13381f4-29742944.pdf?src-supplier=Digi-Key; ComponentLink1Description: https://datasheet.ciiva.com/29742/csd13381f4-29742944.pdf?src-supplier=Digi-Key; ComponentLink2URL: https://datasheet.ciiva.com/30021/csd13381f4-30021964.pdf?src-supplier=Avnet; ComponentLink2Description: https://datasheet.ciiva.com/30021/csd13381f4-30021964.pdf?src-supplier=Avnet; Supplier Part Number 1: 296-38912-1-ND; .SCHCHK: USED
pins: 1 G, 2 S, 3 D

## Q-CSD19536KTTT
designator Q?, comment CSD19536
MOSFET N-CH 100V 200A TO263; Washability: OK; .Creator: M.OZKAN; .PCBCHK: USED; .SCHCHK: USED
footprint D2PAK-TO-263
pins: 1 G, 2 S, 3 D

## Q-CSD23285F5T
designator Q?, comment CSD23285F5T
12V P-CHANNEL FEMTOFET MOSFET; Manufacturer: Texas Instruments; Continuous Drain Current (ID): 5.4A; Rds On Max: 35mR; Input Capacitance: 628pF; Max Power Dissipation: 1.4W; Element Configuration: Single; Washability: OK; .Creator: M.OZKAN; .PCBCHK: USED; Manufacturer Part Number: CSD23285F5T; Stock 1: 16944; Pricing 1: 1 = 0.49000, 10 = 0.41600, 100 = 0.31210 (USD); RoHS: Yes; Mount: Surface Mount; Number of Pins: 3; Min Operating Temperature: -55°C; Max Operating Temperature: 150°C; Drain to Source Voltage (Vdss): 12V; Packaging: Cut Tape; Lead Free: Lead Free; ComponentLink1URL: http://www.ti.com/lit/pdf/slra003?src-supplier=Digi-Key; ComponentLink1Description: http://www.ti.com/lit/pdf/slra003?src-supplier=Digi-Key; ComponentLink2URL: http://www.ti.com/lit/ds/symlink/csd23285f5.pdf?src-supplier=Digi-Key; ComponentLink2Description: http://www.ti.com/lit/ds/symlink/csd23285f5.pdf?src-supplier=Digi-Key; Supplier Part Number 1: 296-44809-1-ND; Supplier 1: Digi-Key; .SCHCHK: USED
footprint 3-XFDFN
pins: 1 G, 2 S, 3 D

## Q-DMP510DL-7
designator Q?, comment DMP510DL-7
MOSFET P-CH 50V 0.18A SOT23; Manufacturer: Diodes; Continuous Drain Current (ID): 180mA; Rds On Max: 10R; Input Capacitance: 24.6pF; Max Power Dissipation: 310mW; Supplier 1: Digi-Key; Supplier Part Number 1: DMP510DL-7DICT-ND; Manufacturer Part Number: DMP510DL-7; Stock: 16501; Pricing: 1=0.38, 10=0.312, 25=0.2612, 100=0.1276, 500=0.1064, 1000=0.074 (USD); RoHS: Yes; Mount: Surface Mount; Case/Package: TO-236-3; Min Operating Temperature: -55°C; Max Operating Temperature: 150°C; Packaging: Tape and Reel; Drain to Source Voltage (Vdss): 50V; ComponentLink1URL: http://www.mouser.com/ds/2/115/DMP510DL-773890.pdf?src-supplier=Mouser; ComponentLink1Description: http://www.mouser.com/ds/2/115/DMP510DL-773890.pdf?src-supplier=Mouser; ComponentLink2URL: http://www.farnell.com/datasheets/2814432.pdf?src-supplier=Farnell; ComponentLink2Description: http://www.farnell.com/datasheets/2814432.pdf?src-supplier=Farnell; ComponentLink3URL: https://www.diodes.com/assets/Datasheets/DMP510DL.pdf?src-supplier=Digi-Key; ComponentLink3Description: https://www.diodes.com/assets/Datasheets/DMP510DL.pdf?src-supplier=Digi-Key
footprint SOT23-3
pins: 1 G, 2 S, 3 D

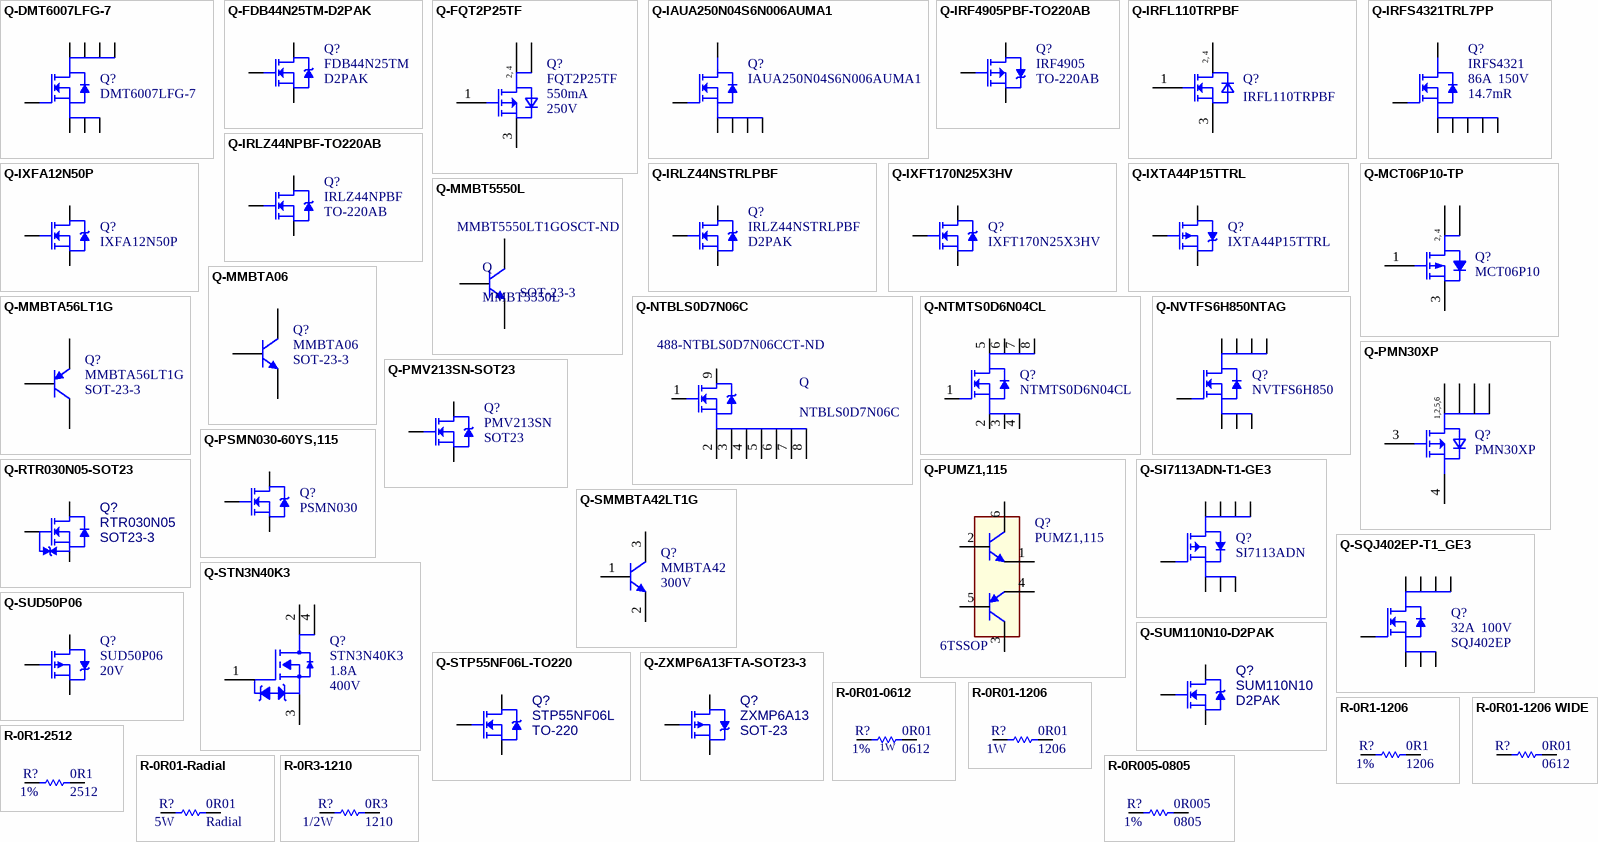
[diagram p34: symbols Q-DMT6007LFG-7 to R-0R005-0805]

## Q-DMT6007LFG-7
designator Q?, comment DMT6007LFG-7
MOSFET 60V N-Ch Enh FET 20Vgss 80A 62.5W; Manufacturer: Diodes; Rds On Max: 6mR; Input Capacitance: 2.09nF; Max Power Dissipation: 2.2W; Supplier 1: RSComponents; Manufacturer Part Number: DMT6007LFG-7; Stock 1: 1920; Pricing 1: 10=0,82200, 50=0,67300, 250=0,58600, 500=0,52000, 1000=0,50600, 10=6,32000, 50=5,18000, 250=4,51000, 500=4,00000, 1000=3,89000 (EUR); RoHS: Yes; Mount: Surface Mount; Number of Pins: 8; Min Operating Temperature: -55°C; Max Operating Temperature: 150°C; Continuous Drain Current (ID): 80A; Packaging: Tape and Reel; Drain to Source Voltage (Vdss): 60V; ComponentLink1URL: http://www.mouser.com/ds/2/115/DMT6007LFG-792694.pdf?src-supplier=Mouser; ComponentLink1Description: http://www.mouser.com/ds/2/115/DMT6007LFG-792694.pdf?src-supplier=Mouser; ComponentLink2URL: https://www.diodes.com/assets/Datasheets/DMT6007LFG.pdf?src-supplier=Digi-Key; ComponentLink2Description: https://www.diodes.com/assets/Datasheets/DMT6007LFG.pdf?src-supplier=Digi-Key; Supplier Part Number 1: 1333320
footprint DMT6007LFG-7
pins: 1 S, 2 S, 3 S, 4 G, 5 D, 6 D, 7 D, 8 D

## Q-FDB44N25TM-D2PAK
designator Q?, comment FDB44N25TM  Case/Package: D2PAK
MOSFET N-CH 250V 44A D2PAK; Manufacturer: ON Semiconductor / Fairchild; Max Power Dissipation: 307W; Number of Elements: 1; Rise Time: 400ns; Rds On Max: 69mR; Input Capacitance: 2.87nF; Nominal Vgs: 5V; Fall Time: 115ns; Turn-Off Delay Time: 85ns; Turn-On Delay Time: 55ns; Element Configuration: Single; Gate to Source Voltage (Vgs): 30V; .PCBCHK: USED; .Creator: F:TALI; Washability: OK; Supplier 1: Digi-Key; Supplier Part Number 1: FDB44N25TMCT-ND; Manufacturer Part Number: FDB44N25TM; Stock 1: 9278; Pricing 1: 1=3.2, 10=2.894, 100=2.3252 (USD); Mount: Surface Mount; Number of Pins: 2; Weight: 1.31247g; Min Operating Temperature: -55°C; Max Operating Temperature: 150°C; Packaging: Tape and Reel; Package Quantity: 1; Continuous Drain Current (ID): 44A; Drain to Source Breakdown Voltage: 250V; Power Dissipation: 307W; Drain to Source Resistance: 69mR; Drain to Source Voltage (Vdss): 250V; Threshold Voltage: 5V; Voltage Rating (DC): 250V; Current Rating: 44A; On-State Resistance: 69mR; Length: 10.67mm; Height: 4.83mm; Width: 11.33mm; Radiation Hardening: No; REACH SVHC: No SVHC; Lead Free: Lead Free; ComponentLink1URL: http://www.farnell.com/datasheets/2299583.pdf; ComponentLink1Description: http://www.farnell.com/datasheets/2299583.pdf; ComponentLink2URL: http://www.fairchildsemi.com/ds/FD/FDB44N25.pdf; ComponentLink2Description: http://www.fairchildsemi.com/ds/FD/FDB44N25.pdf; ComponentLink3URL: https://www.fairchildsemi.com/datasheets/FD/FDB44N25.pdf; ComponentLink3Description: https://www.fairchildsemi.com/datasheets/FD/FDB44N25.pdf; ComponentLink4URL: http://www.farnell.com/datasheets/1781224.pdf; ComponentLink4Description: http://www.farnell.com/datasheets/1781224.pdf; ComponentLink5URL: http://www.fairchildsemi.com/datasheets/FD/FDB44N25.pdf; ComponentLink5Description: http://www.fairchildsemi.com/datasheets/FD/FDB44N25.pdf; .SCHCHK: USED
footprint Model Name (Model Description)
footprint D2PAK-TO-263
pins: 1 G, 2 S, 3 D

## Q-FQT2P25TF
designator Q?, comment FQT2P25TF  Continuous Drain Current (ID): 550mA  Drain to Source Voltage (Vdss): 250V